# Altium footprint library CryptLib.PcbLib: 44 footprints (part 1 of 3)
Each footprint in its own frame and in the unit in brackets; x right, y up, seen from the top. Pads: shape width x height; smd on the part's side, far side on the other; paste and mask are expansions set on the pad; w line width, h text height; cw(c..) or ccw(c..) is an arc to the next point about the centre after c.
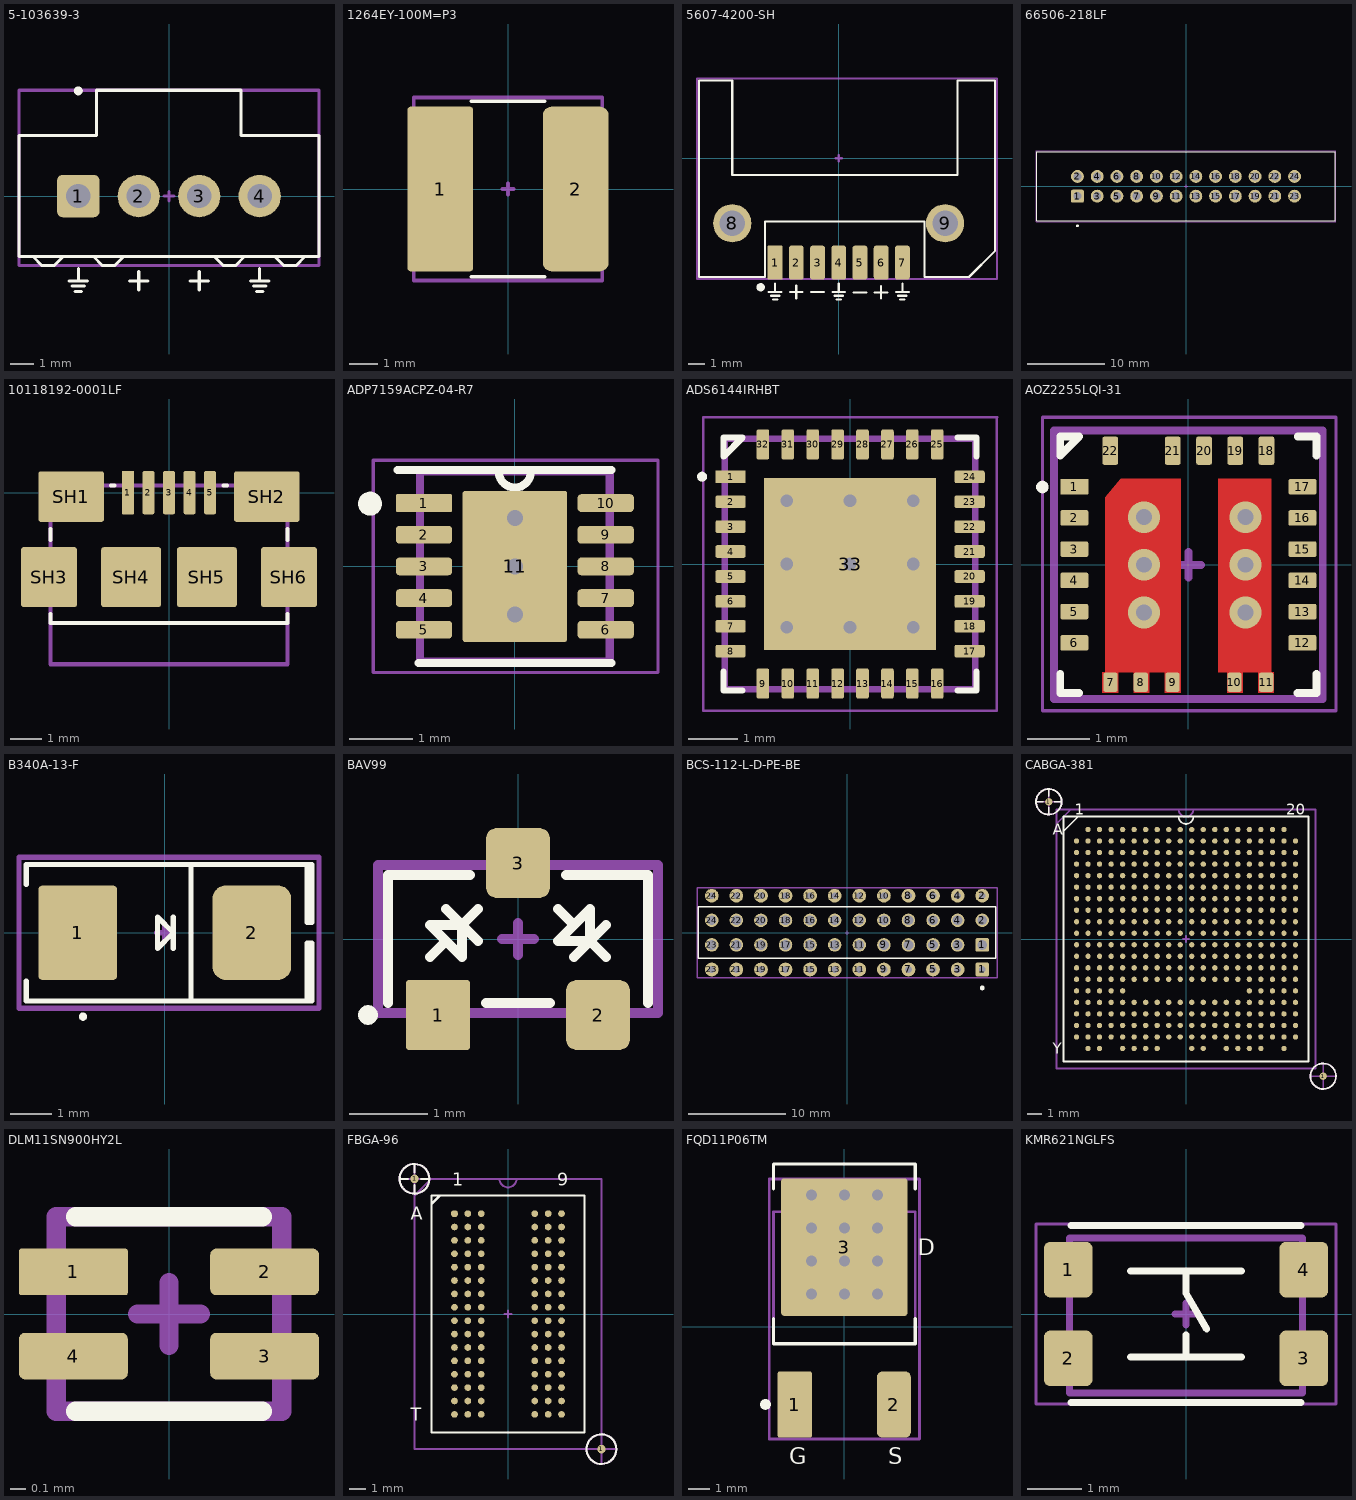
[diagram p0: the footprints below, top view; thin cyan lines are the x and y axes]

## 5-103639-3 [mil]
pads (6):
  rrect25% 70x70 hole 40: 1(-150,0)
  round 70 hole 40: 2(-50,0) 3(50,0) 4(150,0)
  round 7.5 on Mech8: ""(-150,0)
  round 15 on Top Overlay: ""(-150,174)
Top Overlay:
  lines w5: -225,-100 -210,-115 -190,-115 -175,-100 ; -165,-140 -135,-140 ; -160,-149 -140,-149 ; -155,-158 -145,-158 ; -150,-140 -150,-120 ; -125,-100 -110,-115 -90,-115 -75,-100 ; -65,-140 -35,-140 ; -50,-155 -50,-125 ; 35,-140 65,-140 ; 50,-155 50,-125 ; 75,-100 90,-115 110,-115 125,-100 ; 135,-140 165,-140 ; 140,-149 160,-149 ; 145,-158 155,-158 ; 150,-140 150,-120 ; 175,-100 190,-115 210,-115 225,-100 ; -248,-100 248,-100 248,100 119,100 119,175 -120,175 -120,100 -248,100 -248,-100
Top Designator:
  text "'.Designator'" at -113.3,-8.33 h20
Top Assembly:
  lines w5: -8,0 8,0 ; 0,-8 0,8 ; -248,-115 248,-115 248,175 -248,175 -248,-115
3D body "5-103639-3.stp": height 535.54, standoff -129.42, extent -247.43,-114.95 247.45,159.85

## 1264EY-100M=P3 [mil]
pads (3):
  rrect10% 90x225 smd: 1(-92.52,0)
  rrect25% 90x225 smd: 2(92.52,0)
  round 7.5 on Mech8: ""(-92.52,0)
Top Overlay:
  lines w5: -50,-120 50,-120 ; -50,120 50,120
Top Designator:
  text "'.Designator'" at -113.3,-8.33 h20
Top Assembly:
  lines w5: -8,0 8,0 ; 0,-8 0,8 ; -129,-125 129,-125 129,125 -129,125 -129,-125
3D body "1264EY-100M=P3.STEP": height 197.35, standoff 0.5, extent -118.11,-118.1 118.11,118.12

## 5607-4200-SH [mil]
pads (11):
  rrect10% 35x80 smd: 1(-150,-246)
  rrect33% 35x80 smd: 2(-100,-246) 3(-50,-246) 4(0,-246) 5(50,-246) 6(100,-246) 7(150,-246)
  round 90 hole 60: 8(-250.79,-153.15) 9(250.79,-153.15)
  round 20 on Top Overlay: ""(-184,-304)
  round 7.5 on Mech8: ""(-150,-246)
Top Overlay:
  lines w5: -165,-315 -135,-315 ; -160,-324 -140,-324 ; -155,-333 -145,-333 ; -150,-315 -150,-295 ; -115,-315 -85,-315 ; -100,-330 -100,-300 ; -65,-315 -35,-315 ; -15,-315 15,-315 ; -10,-324 10,-324 ; -5,-333 5,-333 ; 0,-315 0,-295 ; 35,-316 65,-316 ; 85,-316 115,-316 ; 100,-331 100,-301 ; 135,-315 165,-315 ; 140,-324 160,-324 ; 145,-333 155,-333 ; 150,-315 150,-295 ; -328.86,-279.92 -174,-279.92 -174,-148.82 202.44,-148.82 202.44,-279.92 307.08,-279.92 368,-219 368,183 280.2,183 280.2,-39.76 -250.91,-39.76 -250.91,183 -328.86,183 -328.86,-279.92
Top Designator:
  text "'.Designator'" at -113.3,-8.33 h20
Top Assembly:
  lines w5: -8,0 8,0 ; 0,-8 0,8 ; -334,-285 373,-285 373,188 -334,188 -334,-285
3D body "5607-4200-SH-01.stp": height 157.98, standoff -105.8, extent -327.9,-278 359.9,174.76

## 66506-218LF [mil]
pads (26):
  rrect25% 65x65 hole 40: 1(-550,-50)
  round 65 hole 40: 2(-550,50) 3(-450,-50) 4(-450,50) 5(-350,-50) 6(-350,50) 7(-250,-50) 8(-250,50) 9(-150,-50) 10(-150,50) 11(-50,-50) 12(-50,50) 13(50,-50) 14(50,50) 15(150,-50) 16(150,50) 17(250,-50) 18(250,50) 19(350,-50) 20(350,50) 21(450,-50) 22(450,50) 23(550,-50) 24(550,50)
  round 15 on Top Overlay: ""(-550,-200)
  round 7.5 on Mech8: ""(-550,-50)
Top Overlay:
  lines w5: -755,-175 -755,175 755,175 755,-175 -755,-175
Top Designator:
  text "'.Designator'" at -113.3,-8.33 h20
Top Assembly:
  lines w5: -8,0 8,0 ; 0,-8 0,8 ; -760,-180 -760,180 760,180 760,-180 -760,-180
3D body "66506-218LFc.stp": height 365.5, standoff -104.5, extent -739.99,-159.99 740.01,160.01

## 10118192-0001LF [mil]
pads (12):
  rrect10% 15x54 smd: 1(-51.18,0)
  rrect33% 15x54 smd: 2(-25.59,0) 3(0,0) 4(25.59,0) 5(51.18,0)
  rrect10% 82x63 smd: SH1(-122.05,-4.92) SH2(122.05,-4.92)
  rrect10% 70x75 smd: SH3(-149.61,-105.31) SH6(149.61,-105.31)
  rrect10% 75x75 smd: SH4(-47.24,-105.31) SH5(47.24,-105.31)
  round 7.5 on Mech8: ""(-51.18,0)
Top Overlay:
  lines w5: -147.64,-151.57 -147.64,-162.4 147.64,-162.4 147.64,-151.57 ; -147.64,-59.06 -147.64,-45.28 ; -72.05,8.86 -67.72,8.86 ; 67.72,8.86 72.05,8.86 ; 147.64,-59.06 147.64,-45.28
Top Designator:
  text "'.Designator'" at -113.3,-8.33 h20
Top Assembly:
  lines w5: -147.64,-162.4 147.64,-162.4 ; -147.64,-162.4 -147.64,8.86 147.64,8.86 147.64,-162.4 ; -147.64,-162.4 -147.64,-214.02 147.64,-214.02 147.64,-162.4
3D body "10118192-0001LF--3DModel-STEP-56544.STEP": height 106.8, standoff -10.13, extent -155.51,-215 155.51,6.26

## ADP7159ACPZ-04-R7 [mil] "VFDFN-10"
height 30
pads (13):
  rrect15% 35x11 smd: 1(-56.5,39.37)
  rrect40% 35x11 smd: 2(-56.5,19.68) 3(-56.5,0) 4(-56.5,-19.68) 5(-56.5,-39.37) 6(56.5,-39.37) 7(56.5,-19.68) 8(56.5,0) 9(56.5,19.68) 10(56.5,39.37)
  rrect5% 65x94 smd: 11(0,0)
  round 15 on Top Overlay: ""(-90,39)
  round 7.5 on Mech8: ""(-56.5,39.37)
via 0,30 diameter 20 hole 10
via 0,-30 diameter 20 hole 10
via 0,0 diameter 20 hole 10
Top Overlay:
  lines w5: -73,60 60,60 ; -60,-60 60,-60 ; -10,59 ccw(c0,59) 10,59
Top Designator:
  text "'.Designator'" at -113.3,-8.33 h20
Top Assembly:
  lines w5: -8,0 8,0 ; 0,-8 0,8 ; -59,-59 59,-59 59,59 -59,59 -59,-59
Top Courtyard (Mech10):
  lines w2: -88,-66 -88,66 89,66 89,-66 -88,-66
3D body "ADP7159ACPZ-04-R7.STEP": height 33.96, standoff 0.5, extent -59.06,-59.06 59.06,59.06

## ADS6144IRHBT [mil] "VQFN-32 (5x5)"
height 40
pads (35):
  rrect10% 24x10 smd: 1(-94.49,68.9)
  rrect33% 24x10 smd: 2(-94.49,49.21) 3(-94.49,29.53) 4(-94.49,9.84) 5(-94.49,-9.84) 6(-94.49,-29.53) 7(-94.49,-49.21) 8(-94.49,-68.9) 17(94.49,-68.9) 18(94.49,-49.21) 19(94.49,-29.53) 20(94.49,-9.84) 21(94.49,9.84) 22(94.49,29.53) 23(94.49,49.21) 24(94.49,68.9)
  rrect33% 10x24 smd: 9(-68.9,-94.49) 10(-49.21,-94.49) 11(-29.53,-94.49) 12(-9.84,-94.49) 13(9.84,-94.49) 14(29.53,-94.49) 15(49.21,-94.49) 16(68.9,-94.49) 25(68.9,94.49) 26(49.21,94.49) 27(29.53,94.49) 28(9.84,94.49) 29(-9.84,94.49) 30(-29.53,94.49) 31(-49.21,94.49) 32(-68.9,94.49)
  rect 135.83x135.83 smd paste-118.11 mask+0: 33(0,0)
  round 8 on Top Overlay: ""(-117,69)
  round 7.5 on Mech8: ""(-94.49,68.9)
via 50,-50 diameter 20 hole 10
via -50,-50 diameter 20 hole 10
via -50,50 diameter 20 hole 10
via 50,50 diameter 20 hole 10
via 0,50 diameter 20 hole 10
via 50,0 diameter 20 hole 10
via 0,-50 diameter 20 hole 10
via -50,0 diameter 20 hole 10
via 0,0 diameter 20 hole 10
Top Overlay:
  lines w5: -100,-85 -100,-100 -85,-100 ; 85,-100 100,-100 100,-85 ; 85,100 100,100 100,85 ; -100,85 -100,100 -85,100 -100,85
Top Paste:
  region: 62.6,-62.6 3.94,-62.6 3.94,-3.94 62.6,-3.94
  region: -3.94,-62.6 -62.6,-62.6 -62.6,-3.94 -3.94,-3.94
  region: 62.6,3.94 3.94,3.94 3.94,62.6 62.6,62.6
  region: -3.94,3.94 -62.6,3.94 -62.6,62.6 -3.94,62.6
Top Solder:
  drawing of 33 lines, arcs and shapes, not listed
Top Designator:
  text "'.Designator'" at -113.3,-8.33 h20
Top Assembly:
  lines w5: -99,98.43 -99,-99 98.43,-99 ; -98.43,99 99,99 99,-98.43 ; -8,0 8,0 ; 0,-8 0,8
Top Courtyard (Mech10):
  lines w2: -116.14,-116 116,-116 116,116.14 ; -116,-116.14 -116,116 116.14,116
3D body "ADS6144IRHBT.STEP": height 39.87, standoff 0.5, extent -98.43,-98.43 98.43,98.43

## AOZ2255LQI-31 [mm] "PowerVFQFN-22"
height 0.889
pads (24):
  rrect10% 0.45x0.25 smd: 1(-1.825,1.25)
  rrect25% 0.45x0.25 smd: 2(-1.825,0.75) 3(-1.825,0.25) 4(-1.825,-0.25) 5(-1.825,-0.75) 6(-1.825,-1.25) 12(1.825,-1.25) 13(1.825,-0.75) 14(1.825,-0.25) 15(1.825,0.25) 16(1.825,0.75) 17(1.825,1.25)
  rrect25% 0.229x0.305 smd: 7(-1.245,-1.88) 8(-0.762,-1.88) 9(-0.254,-1.88) 10(0.737,-1.88) 11(1.245,-1.88)
  rrect25% 0.25x0.45 smd: 18(1.25,1.825) 19(0.75,1.825) 20(0.25,1.825) 21(-0.25,1.825) 22(-1.25,1.825)
  round 0.203 on Top Overlay: ""(-2.337,1.245)
  round 0.191 on Mech8: ""(-1.825,1.25)
via -0.711,-0.762 diameter 0.508 hole 0.254
via -0.711,0.762 diameter 0.508 hole 0.254
via -0.711,0 diameter 0.508 hole 0.254
via 0.914,-0.762 diameter 0.508 hole 0.254
via 0.914,0.762 diameter 0.508 hole 0.254
via 0.914,0 diameter 0.508 hole 0.254
Top Layer:
  region: -0.125,1.38 -1.08,1.38 -1.33,1.08 -1.33,-1.72 -1.375,-1.72 -1.375,-2.05 -1.125,-2.05 -1.125,-1.72 -0.875,-1.72 -0.875,-2.05 -0.625,-2.05 -0.625,-1.72 -0.375,-1.72 -0.375,-2.05 -0.125,-2.05
  region: 0.475,1.38 0.475,-1.72 0.62,-1.72 0.62,-2.05 0.87,-2.05 0.87,-1.72 1.12,-1.72 1.12,-2.05 1.37,-2.05 1.37,-1.72 1.33,-1.72 1.33,1.38
Top Overlay:
  lines w0.127: -2.05,-1.75 -2.05,-2.05 -1.75,-2.05 ; 1.745,-2.05 2.05,-2.05 2.05,-1.75 ; 1.75,2.05 2.05,2.05 2.05,1.75 ; -2.05,1.75 -2.05,2.05 -1.75,2.05 -2.05,1.75
Top Designator:
  text "'.Designator'" at -2.878,-0.212 h0.51
Top Assembly:
  lines w0.127: -0.203,0 0.203,0 ; 0,-0.203 0,0.203 ; -2.15,-2.15 2.15,-2.15 2.15,2.15 -2.15,2.15 -2.15,-2.15
Top Courtyard (Mech10):
  lines w0.051: -2.337,-2.337 2.362,-2.337 2.362,2.362 -2.337,2.362 -2.337,-2.337
3D body "IC_Alpha_&_Omega_AOZ2255LQI-31_eec.STEP": height 1.05, standoff 0, extent -2,-2 2,2

## B340A-13-F [mil]
pads (4):
  rrect10% 75x90 smd: 1(-83,0)
  rrect33% 75x90 smd: 2(83,0)
  round 7.5 on Mech8: ""(-83,0)
  round 8 on Top Overlay: ""(-78,-80)
Top Overlay:
  lines w5: -132,-46 -132,-65 140,-65 140,-10 135.5,-10 135.5,-65 ; -132,46 -132,65 140,65 140,10 135.5,10 135.5,65 ; 8,-15 8,15 ; 25,-65 25,65 ; -7,-15 -7,15 8,0 -7,-15
Top Designator:
  text "'.Designator'" at -113.3,-8.33 h20
Top Assembly:
  lines w5: -8,0 8,0 ; 0,-8 0,8 ; -139,-72 147,-72 147,72 -139,72 -139,-72
3D body "SMA.STEP": height 94.49, standoff 0, extent -102.36,-54.12 102.37,54.12

## BAV99 [mil]
pads (5):
  rrect10% 32x35 smd: 1(-40,-38)
  rrect33% 32x35 smd: 2(40,-38) 3(0,38)
  round 10 on Top Overlay: ""(-75,-38)
  round 7.5 on Mech8: ""(-40,-38)
Top Overlay:
  lines w5: -65,-32 -65,32 -24,32 ; -44,-9 -36,-1 ; -36,15 -28,7 ; -20,-1 -28,7 ; -20,15 -28,7 ; -16,-32 16,-32 ; 20,15 28,7 ; 24,32 65,32 65,-32 ; 28,-9 36,-1 ; 44,-9 36,-1 ; 44,7 36,-1 ; -36,-1 -28,-9 -28,7 ; -36,-1 -44,7 -28,7 ; 28,7 36,15 36,-1 ; 28,7 20,-1 36,-1
Top Designator:
  text "'.Designator'" at -113.3,-8.33 h20
Top Assembly:
  lines w5: -8,0 8,0 ; 0,-8 0,8 ; -70,-37 -70,37 70,37 70,-37 -70,-37
3D body "User Library-sot-3p290x130ll237h100.step": height 39.57, standoff 0, extent -57.09,-46.64 57.08,46.66

## BCS-112-L-D-PE-BE [mil]
pads (50):
  rrect25% 56x56 hole 28 mask+0: 1(550,-150)
  rrect25% 55x55 hole 40 mask+0: 1(550,-50)
  round 55 / inner round 40 / far side round 40 hole 40 mask+0: 2(550,50) 3(450,-50) 4(450,50) 5(350,-50) 6(350,50) 7(250,-50) 8(250,50) 9(150,-50) 10(150,50) 11(50,-50) 12(50,50) 13(-50,-50) 14(-50,50) 15(-150,-50) 16(-150,50) 17(-250,-50) 18(-250,50) 19(-350,-50) 20(-350,50) 21(-450,-50) 22(-450,50) 23(-550,-50) 24(-550,50)
  round 56 / inner round 50 / far side round 50 hole 28 mask+0: 2(550,150) 3(450,-150) 4(450,150) 5(350,-150) 6(350,150) 7(250,-150) 8(250,150) 9(150,-150) 10(150,150) 11(50,-150) 12(50,150) 13(-50,-150) 14(-50,150) 15(-150,-150) 16(-150,150) 17(-250,-150) 18(-250,150) 19(-350,-150) 20(-350,150) 21(-450,-150) 22(-450,150) 23(-550,-150) 24(-550,150)
  round 20 on Top Overlay: ""(550,-225)
  round 7.5 on Mech8: ""(550,-150)
Top Overlay:
  lines w6: -605,-105 -605,105 605,105 605,-105 -605,-105
Top Designator:
  text "'.Designator'" at -113.3,-8.33 h20
Top Assembly:
  lines w5: -8,0 8,0 ; 0,-8 0,8
  lines w6: -610,-183 610,-183 610,183 -610,183 -610,-183
3D body "BCS-112-L-D-PE-BE.stp": height 293.5, standoff -127.5, extent -600.01,-155 599.99,155

## CABGA-381 [mm]
pads (383):
  round 0.508 smd paste-25.375 mask+0.508: 1(-9.525,9.525) 1(9.525,-9.525)
  round 0.37 smd paste-25.375: A2(-6.8,7.6) A3(-6,7.6) A4(-5.2,7.6) A5(-4.4,7.6) A6(-3.6,7.6) A7(-2.8,7.6) A8(-2,7.6) A9(-1.2,7.6) A10(-0.4,7.6) A11(0.4,7.6) A12(1.2,7.6) A13(2,7.6) A14(2.8,7.6) A15(3.6,7.6) A16(4.4,7.6) A17(5.2,7.6) A18(6,7.6) A19(6.8,7.6) B1(-7.6,6.8) B2(-6.8,6.8) B3(-6,6.8) B4(-5.2,6.8) B5(-4.4,6.8) B6(-3.6,6.8) B7(-2.8,6.8) B8(-2,6.8) B9(-1.2,6.8) B10(-0.4,6.8) B11(0.4,6.8) B12(1.2,6.8) B13(2,6.8) B14(2.8,6.8) B15(3.6,6.8) B16(4.4,6.8) B17(5.2,6.8) B18(6,6.8) B19(6.8,6.8) B20(7.6,6.8) C1(-7.6,6) C2(-6.8,6) C3(-6,6) C4(-5.2,6) C5(-4.4,6) C6(-3.6,6) C7(-2.8,6) C8(-2,6) C9(-1.2,6) C10(-0.4,6) C11(0.4,6) C12(1.2,6) C13(2,6) C14(2.8,6) C15(3.6,6) C16(4.4,6) C17(5.2,6) C18(6,6) C19(6.8,6) C20(7.6,6) D1(-7.6,5.2) D2(-6.8,5.2) D3(-6,5.2) D4(-5.2,5.2) D5(-4.4,5.2) D6(-3.6,5.2) D7(-2.8,5.2) D8(-2,5.2) D9(-1.2,5.2) D10(-0.4,5.2) D11(0.4,5.2) D12(1.2,5.2) D13(2,5.2) D14(2.8,5.2) D15(3.6,5.2) D16(4.4,5.2) D17(5.2,5.2) D18(6,5.2) D19(6.8,5.2) D20(7.6,5.2) E1(-7.6,4.4) E2(-6.8,4.4) E3(-6,4.4) E4(-5.2,4.4) E5(-4.4,4.4) E6(-3.6,4.4) E7(-2.8,4.4) E8(-2,4.4) E9(-1.2,4.4) E10(-0.4,4.4) E11(0.4,4.4) E12(1.2,4.4) E13(2,4.4) E14(2.8,4.4) E15(3.6,4.4) E16(4.4,4.4) E17(5.2,4.4) E18(6,4.4) E19(6.8,4.4) E20(7.6,4.4) F1(-7.6,3.6) F2(-6.8,3.6) F3(-6,3.6) F4(-5.2,3.6) F5(-4.4,3.6) F6(-3.6,3.6) F7(-2.8,3.6) F8(-2,3.6) F9(-1.2,3.6) F10(-0.4,3.6) F11(0.4,3.6) F12(1.2,3.6) F13(2,3.6) F14(2.8,3.6) F15(3.6,3.6) F16(4.4,3.6) F17(5.2,3.6) F18(6,3.6) F19(6.8,3.6) F20(7.6,3.6) G1(-7.6,2.8) G2(-6.8,2.8) G3(-6,2.8) G4(-5.2,2.8) G5(-4.4,2.8) G6(-3.6,2.8) G7(-2.8,2.8) G8(-2,2.8) G9(-1.2,2.8) G10(-0.4,2.8) G11(0.4,2.8) G12(1.2,2.8) G13(2,2.8) G14(2.8,2.8) G15(3.6,2.8) G16(4.4,2.8) G17(5.2,2.8) G18(6,2.8) G19(6.8,2.8) G20(7.6,2.8) H1(-7.6,2) H2(-6.8,2) H3(-6,2) H4(-5.2,2) H5(-4.4,2) H6(-3.6,2) H7(-2.8,2) H8(-2,2) H9(-1.2,2) H10(-0.4,2) H11(0.4,2) H12(1.2,2) H13(2,2) H14(2.8,2) H15(3.6,2) H16(4.4,2) H17(5.2,2) H18(6,2) H19(6.8,2) H20(7.6,2) J1(-7.6,1.2) J2(-6.8,1.2) J3(-6,1.2) J4(-5.2,1.2) J5(-4.4,1.2) J6(-3.6,1.2) J7(-2.8,1.2) J8(-2,1.2) J9(-1.2,1.2) J10(-0.4,1.2) J11(0.4,1.2) J12(1.2,1.2) J13(2,1.2) J14(2.8,1.2) J15(3.6,1.2) J16(4.4,1.2) J17(5.2,1.2) J18(6,1.2) J19(6.8,1.2) J20(7.6,1.2) K1(-7.6,0.4) K2(-6.8,0.4) K3(-6,0.4) K4(-5.2,0.4) K5(-4.4,0.4) K6(-3.6,0.4) K7(-2.8,0.4) K8(-2,0.4) K9(-1.2,0.4) K10(-0.4,0.4) K11(0.4,0.4) K12(1.2,0.4) K13(2,0.4) K14(2.8,0.4) K15(3.6,0.4) K16(4.4,0.4) K17(5.2,0.4) K18(6,0.4) K19(6.8,0.4) K20(7.6,0.4) L1(-7.6,-0.4) L2(-6.8,-0.4) L3(-6,-0.4) L4(-5.2,-0.4) L5(-4.4,-0.4) L6(-3.6,-0.4) L7(-2.8,-0.4) L8(-2,-0.4) L9(-1.2,-0.4) L10(-0.4,-0.4) L11(0.4,-0.4) L12(1.2,-0.4) L13(2,-0.4) L14(2.8,-0.4) L15(3.6,-0.4) L16(4.4,-0.4) L17(5.2,-0.4) L18(6,-0.4) L19(6.8,-0.4) L20(7.6,-0.4) M1(-7.6,-1.2) M2(-6.8,-1.2) M3(-6,-1.2) M4(-5.2,-1.2) M5(-4.4,-1.2) M6(-3.6,-1.2) M7(-2.8,-1.2) M8(-2,-1.2) M9(-1.2,-1.2) M10(-0.4,-1.2) M11(0.4,-1.2) M12(1.2,-1.2) M13(2,-1.2) M14(2.8,-1.2) M15(3.6,-1.2) M16(4.4,-1.2) M17(5.2,-1.2) M18(6,-1.2) M19(6.8,-1.2) M20(7.6,-1.2) N1(-7.6,-2) N2(-6.8,-2) N3(-6,-2) N4(-5.2,-2) N5(-4.4,-2) N6(-3.6,-2) N7(-2.8,-2) N8(-2,-2) N9(-1.2,-2) N10(-0.4,-2) N11(0.4,-2) N12(1.2,-2) N13(2,-2) N14(2.8,-2) N15(3.6,-2) N16(4.4,-2) N17(5.2,-2) N18(6,-2) N19(6.8,-2) N20(7.6,-2) P1(-7.6,-2.8) P2(-6.8,-2.8) P3(-6,-2.8) P4(-5.2,-2.8) P5(-4.4,-2.8) P6(-3.6,-2.8) P7(-2.8,-2.8) P8(-2,-2.8) P9(-1.2,-2.8) P10(-0.4,-2.8) P11(0.4,-2.8) P12(1.2,-2.8) P13(2,-2.8) P14(2.8,-2.8) P15(3.6,-2.8) P16(4.4,-2.8) P17(5.2,-2.8) P18(6,-2.8) P19(6.8,-2.8) P20(7.6,-2.8) R1(-7.6,-3.6) R2(-6.8,-3.6) R3(-6,-3.6) R4(-5.2,-3.6) R5(-4.4,-3.6) R16(4.4,-3.6) R17(5.2,-3.6) R18(6,-3.6) R19(6.8,-3.6) R20(7.6,-3.6) T1(-7.6,-4.4) T2(-6.8,-4.4) T3(-6,-4.4) T4(-5.2,-4.4) T5(-4.4,-4.4) T6(-3.6,-4.4) T7(-2.8,-4.4) T8(-2,-4.4) T9(-1.2,-4.4) T10(-0.4,-4.4) T11(0.4,-4.4) T12(1.2,-4.4) T13(2,-4.4) T14(2.8,-4.4) T15(3.6,-4.4) T16(4.4,-4.4) T17(5.2,-4.4) T18(6,-4.4) T19(6.8,-4.4) T20(7.6,-4.4) U1(-7.6,-5.2) U2(-6.8,-5.2) U3(-6,-5.2) U4(-5.2,-5.2) U5(-4.4,-5.2) U6(-3.6,-5.2) U7(-2.8,-5.2) U8(-2,-5.2) U9(-1.2,-5.2) U10(-0.4,-5.2) U11(0.4,-5.2) U12(1.2,-5.2) U13(2,-5.2) U14(2.8,-5.2) U15(3.6,-5.2) U16(4.4,-5.2) U17(5.2,-5.2) U18(6,-5.2) U19(6.8,-5.2) U20(7.6,-5.2) V1(-7.6,-6) V2(-6.8,-6) V3(-6,-6) V4(-5.2,-6) V5(-4.4,-6) V6(-3.6,-6) V7(-2.8,-6) V8(-2,-6) V9(-1.2,-6) V10(-0.4,-6) V11(0.4,-6) V12(1.2,-6) V13(2,-6) V14(2.8,-6) V15(3.6,-6) V16(4.4,-6) V17(5.2,-6) V18(6,-6) V19(6.8,-6) V20(7.6,-6) W1(-7.6,-6.8) W2(-6.8,-6.8) W3(-6,-6.8) W4(-5.2,-6.8) W5(-4.4,-6.8) W6(-3.6,-6.8) W7(-2.8,-6.8) W8(-2,-6.8) W9(-1.2,-6.8) W10(-0.4,-6.8) W11(0.4,-6.8) W12(1.2,-6.8) W13(2,-6.8) W14(2.8,-6.8) W15(3.6,-6.8) W16(4.4,-6.8) W17(5.2,-6.8) W18(6,-6.8) W19(6.8,-6.8) W20(7.6,-6.8) Y2(-6.8,-7.6) Y3(-6,-7.6) Y5(-4.4,-7.6) Y6(-3.6,-7.6) Y7(-2.8,-7.6) Y8(-2,-7.6) Y11(0.4,-7.6) Y12(1.2,-7.6) Y14(2.8,-7.6) Y15(3.6,-7.6) Y16(4.4,-7.6) Y17(5.2,-7.6) Y19(6.8,-7.6)
Top Overlay:
  circle w0.127: c-9.525,9.525 r0.889
  circle w0.127: c9.525,-9.525 r0.889
  lines w0.127: -10.414,9.525 -9.906,9.525 ; -9.525,8.636 -9.525,9.144 ; -9.525,9.906 -9.525,10.414 ; -9.144,9.525 -8.636,9.525 ; -8.5,7.5 -7.5,8.5 ; -0.508,8.5 ccw(c0,8.5) 0.508,8.5 ; -8.5,-8.5 -8.5,8.5 8.5,8.5 8.5,-8.5 -8.5,-8.5
  text "Y" at -9.254,-7.973 h0.76
  text "20" at 6.965,8.617 h0.76
  text "A" at -9.254,7.227 h0.76
  text "1" at -7.727,8.617 h0.76
Top Designator:
  text "'.Comment'" at -2.158,-1.515 h0.51
  text "'.Designator'" at -2.878,-0.212 h0.51
Top Assembly:
  circle w0.127: c-9.525,9.525 r0.889
  circle w0.127: c9.525,-9.525 r0.889
  lines w0.127: -10.414,9.525 -8.636,9.525 ; -9.525,8.636 -9.525,10.414 ; -8.992,7.992 -7.992,8.992 ; -0.508,9 ccw(c0,9) 0.508,9 ; -0.203,0 0.203,0 ; 0,-0.203 0,0.203 ; 8.636,-9.525 10.414,-9.525 ; 9.525,-10.414 9.525,-8.636 ; -9,-9 9,-9 9,9 -9,9 -9,-9
3D body "LFE5UM-45F-8BG381C.STEP": height 0.88, standoff -0.02, extent -8.5,-8.5 8.5,8.5

## DLM11SN900HY2L [mil]
pads (5):
  rrect10% 28x12 smd: 1(-24.61,10.83)
  rrect25% 28x12 smd: 2(24.61,10.83) 3(24.61,-10.83) 4(-24.61,-10.83)
  round 7.5 on Mech8: ""(-24.61,10.83)
Top Overlay:
  lines w5: -24,-25 24,-25 ; -24,25 24,25
Top Designator:
  text "'.Designator'" at -113.3,-8.33 h20
Top Assembly:
  lines w5: -8,0 8,0 ; 0,-8 0,8 ; -29,-25 -29,25 29,25 29,-25 -29,-25
3D body "DLM11SN900HY2L.STEP": height 24.12, standoff 0.5, extent -24.61,-19.68 24.6,19.69

## FBGA-96 [mm]
pads (99):
  round 0.508 smd paste-25.375 mask+0.508: 1(-5.588,8.077) 1(5.588,-8.077)
  rrect75% 0.4x0.4 smd paste-25.375: A1(-3.2,6)
  round 0.4 smd paste-25.375: A2(-2.4,6) A3(-1.6,6) A7(1.6,6) A8(2.4,6) A9(3.2,6) B1(-3.2,5.2) B2(-2.4,5.2) B3(-1.6,5.2) B7(1.6,5.2) B8(2.4,5.2) B9(3.2,5.2) C1(-3.2,4.4) C2(-2.4,4.4) C3(-1.6,4.4) C7(1.6,4.4) C8(2.4,4.4) C9(3.2,4.4) D1(-3.2,3.6) D2(-2.4,3.6) D3(-1.6,3.6) D7(1.6,3.6) D8(2.4,3.6) D9(3.2,3.6) E1(-3.2,2.8) E2(-2.4,2.8) E3(-1.6,2.8) E7(1.6,2.8) E8(2.4,2.8) E9(3.2,2.8) F1(-3.2,2) F2(-2.4,2) F3(-1.6,2) F7(1.6,2) F8(2.4,2) F9(3.2,2) G1(-3.2,1.2) G2(-2.4,1.2) G3(-1.6,1.2) G7(1.6,1.2) G8(2.4,1.2) G9(3.2,1.2) H1(-3.2,0.4) H2(-2.4,0.4) H3(-1.6,0.4) H7(1.6,0.4) H8(2.4,0.4) H9(3.2,0.4) J1(-3.2,-0.4) J2(-2.4,-0.4) J3(-1.6,-0.4) J7(1.6,-0.4) J8(2.4,-0.4) J9(3.2,-0.4) K1(-3.2,-1.2) K2(-2.4,-1.2) K3(-1.6,-1.2) K7(1.6,-1.2) K8(2.4,-1.2) K9(3.2,-1.2) L1(-3.2,-2) L2(-2.4,-2) L3(-1.6,-2) L7(1.6,-2) L8(2.4,-2) L9(3.2,-2) M1(-3.2,-2.8) M2(-2.4,-2.8) M3(-1.6,-2.8) M7(1.6,-2.8) M8(2.4,-2.8) M9(3.2,-2.8) N1(-3.2,-3.6) N2(-2.4,-3.6) N3(-1.6,-3.6) N7(1.6,-3.6) N8(2.4,-3.6) N9(3.2,-3.6) P1(-3.2,-4.4) P2(-2.4,-4.4) P3(-1.6,-4.4) P7(1.6,-4.4) P8(2.4,-4.4) P9(3.2,-4.4) R1(-3.2,-5.2) R2(-2.4,-5.2) R3(-1.6,-5.2) R7(1.6,-5.2) R8(2.4,-5.2) R9(3.2,-5.2) T1(-3.2,-6) T2(-2.4,-6) T3(-1.6,-6) T7(1.6,-6) T8(2.4,-6) T9(3.2,-6)
  round 0.191 on Mech8: ""(-3.2,6)
Top Overlay:
  circle w0.127: c5.588,-8.077 r0.889
  circle w0.127: c-5.588,8.077 r0.889
  lines w0.127: -6.477,8.077 -5.969,8.077 ; -5.588,7.188 -5.588,7.696 ; -5.588,8.458 -5.588,8.966 ; -5.207,8.077 -4.699,8.077 ; -4.572,6.579 -4.064,7.087 ; -4.572,-7.087 4.572,-7.087 4.572,7.087 -4.572,7.087 -4.572,-7.087
  text "A" at -5.804,5.627 h0.76
  text "1" at -3.327,7.667 h0.76
  text "T" at -5.804,-6.383 h0.76
  text "9" at 2.946,7.667 h0.76
Top Designator:
  text "'.Comment'" at -2.158,-1.541 h0.51
  text "'.Designator'" at -2.878,-0.212 h0.51
Top Assembly:
  circle w0.127: c5.588,-8.077 r0.889
  circle w0.127: c-5.588,8.077 r0.889
  lines w0.127: -6.477,8.077 -4.699,8.077 ; -5.588,7.077 -4.588,8.077 ; -5.588,7.188 -5.588,8.966 ; -0.508,8.077 ccw(c0,8.077) 0.508,8.077 ; -0.203,0 0.203,0 ; 0,-0.203 0,0.203 ; 4.699,-8.077 6.477,-8.077 ; 5.588,-8.966 5.588,-7.188 ; -5.588,-8.077 5.588,-8.077 5.588,8.077 -5.588,8.077 -5.588,-8.077
3D body "User Library-96-FBGA (14X9).step": height 1.11, standoff 0.01, extent -4.5,-7 4.5,7

## FQD11P06TM [mil]
pads (5):
  rrect10% 62x120 smd: 1(-90,-141)
  rrect33% 62x120 smd: 2(90,-141)
  rrect5% 230x250 smd paste-999: 3(0,145)
  round 20 on Top Overlay: ""(-143.31,-140.74)
  round 7.5 on Mech8: ""(-90,-141)
via -60,240 diameter 40 hole 20
via 60,240 diameter 40 hole 20
via 60,120 diameter 40 hole 20
via -60,120 diameter 40 hole 20
via 60,60 diameter 40 hole 20
via 0,60 diameter 40 hole 20
via -60,60 diameter 40 hole 20
via 0,120 diameter 40 hole 20
via 0,240 diameter 40 hole 20
via 0,180 diameter 40 hole 20
via 60,180 diameter 40 hole 20
via -60,180 diameter 40 hole 20
Top Overlay:
  lines w5.91: -128.74,14.66 -128.74,-30.5 128.74,-30.5 128.74,14.66 ; -128.74,250.84 -128.74,296 128.74,296 128.74,250.84
  text "G" at -100,-249 h30
  text "S" at 80,-249 h30
  text "D" at 133,130 h30
Top Paste:
  rectangle: 35,25 85,35
  rectangle: -25,25 25,35
  rectangle: -85,25 -35,35
  rectangle: 35,85 85,95
  rectangle: -25,85 25,95
  rectangle: -85,85 -35,95
  rectangle: 35,145 85,155
  rectangle: -25,145 25,155
  rectangle: -85,145 -35,155
  rectangle: 35,205 85,215
  rectangle: -25,205 25,215
  rectangle: -85,205 -35,215
  rectangle: -110,25 -85,265
  rectangle: 85,25 110,265
  rectangle: -35,25 -25,265
  rectangle: 25,25 35,265
Top Designator:
  text "'.Designator'" at -113.3,-8.33 h20
Top Assembly:
  lines w5: -13,52 13,52 ; 0,39 0,65 ; -136.42,-203.72 136.42,-203.72 136.42,268.71 -136.42,268.71 -136.42,-203.72 ; -128.74,-30.5 -128.74,209.47 128.74,209.47 128.74,-30.5 -128.74,-30.5
3D body "User Library-DPAK-1.step": height 90.46, standoff -4.62, extent -128.74,-176.76 128.74,214.51

## KMR621NGLFS [mil]
height 75
pads (5):
  rrect25% 35x40 smd: 1(-85,32) 2(-85,-32) 3(85,-32) 4(85,32)
  round 7.5 on Mech8: ""(-85,32)
Top Overlay:
  lines w5: -83,-64 83,-64 ; -83,64 83,64 ; -40,-31 40,-31 ; -40,31 40,31 ; 0,-31 0,-15 ; 0,31 0,15 15,-10.98
Top Designator:
  text "'.Designator'" at -113.3,-8.33 h20
Top Assembly:
  lines w5: -8,0 8,0 ; 0,-8 0,8 ; -84,-57 84,-57 84,55 -84,55 -84,-57
Top Courtyard (Mech10):
  lines w2: -108.27,-64.96 108.27,-64.96 108.27,64.96 -108.27,64.96 -108.27,-64.96
3D body "KMR621NG LFS--3DModel-STEP-56544.STEP": height 75.3, standoff 0.5, extent -92.55,-55.12 88.55,55.12